# Altium footprint library JL_PCB.PCBLIB: 1129 footprints (part 47 of 72)
Each footprint in its own frame and in the unit in brackets; x right, y up, seen from the top. Pads: shape width x height; smd on the part's side, far side on the other; paste and mask are expansions set on the pad; w line width, h text height; cw(c..) or ccw(c..) is an arc to the next point about the centre after c.
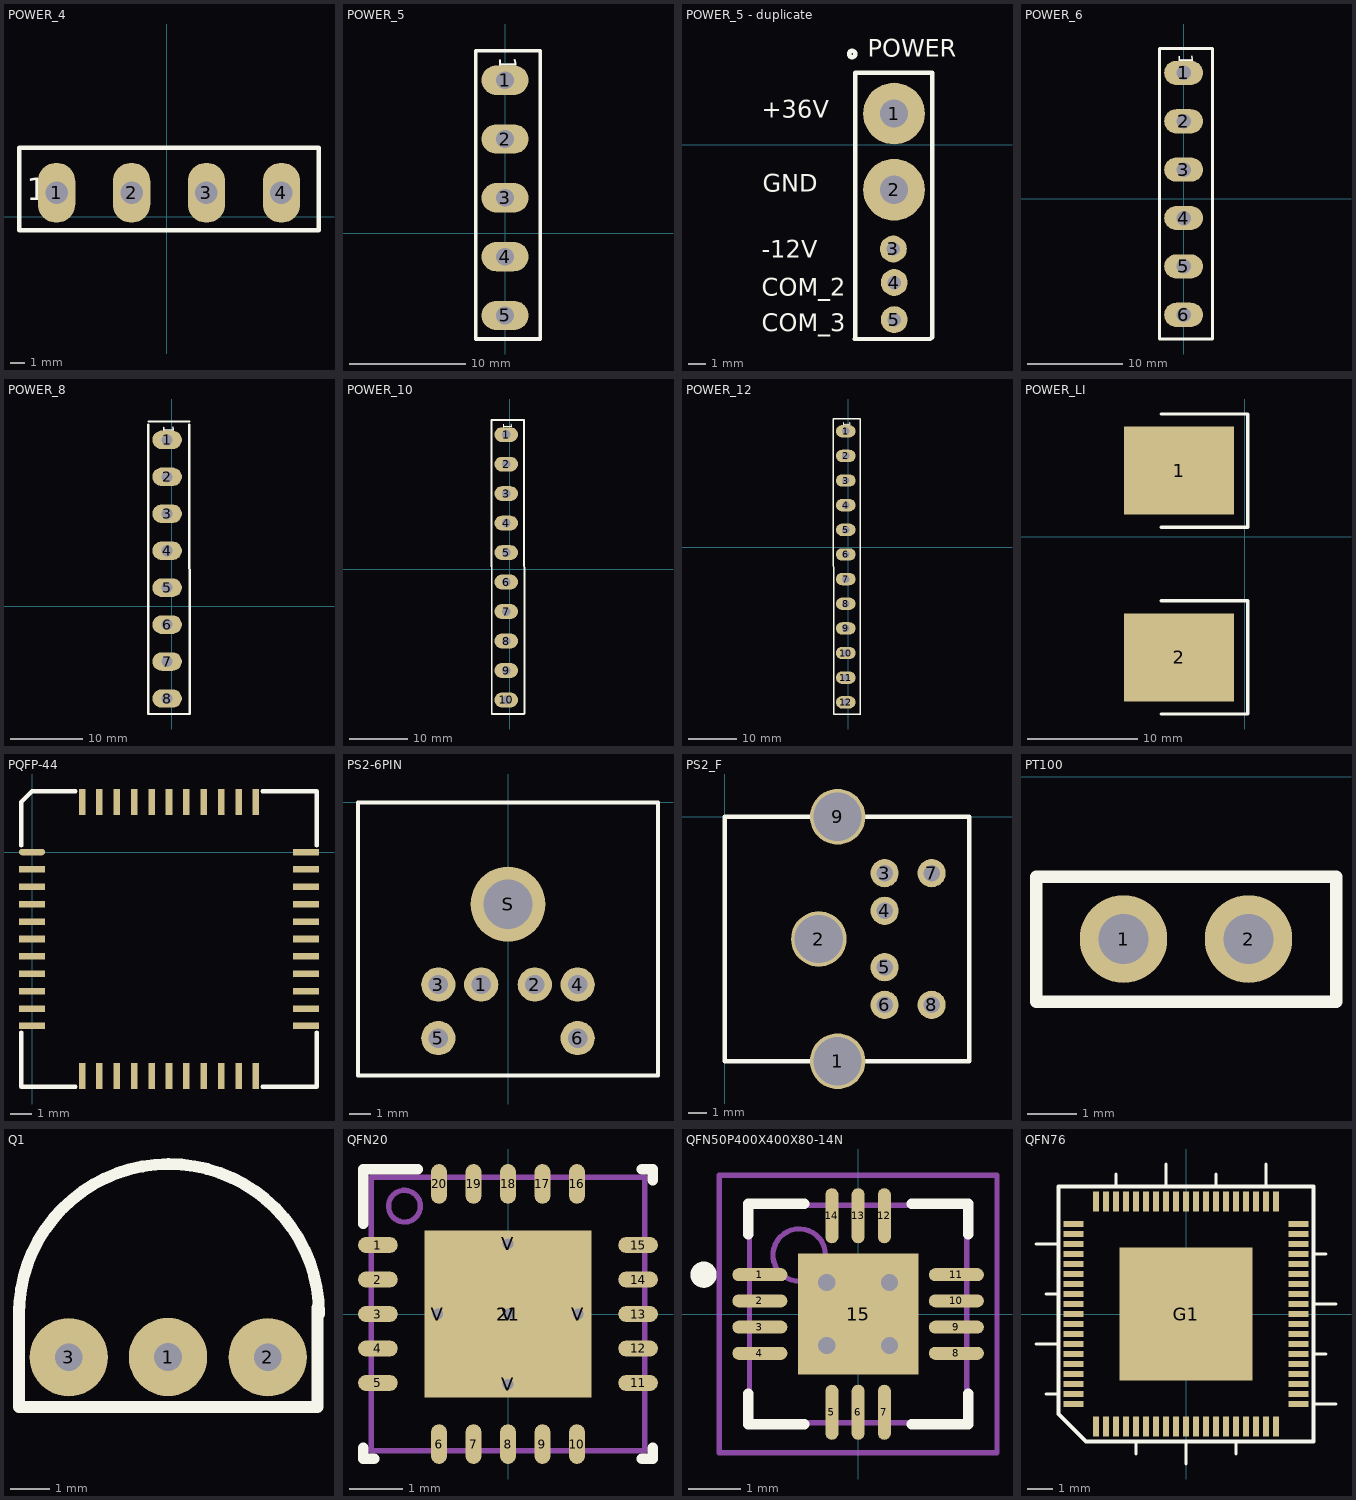
[diagram p46: the footprints below, top view; thin cyan lines are the x and y axes]

## POWER_4 [mil]
pads (4):
  oval 100x160 hole 60: 1(-294,64) 2(-94,64) 3(106,64) 4(306,64)
TopOverlay:
  lines w12: -394,-36 -394,184 406,184 406,-36 -394,-36
  text "1" at -374,44 h60

## POWER_5 [mil]
pads (5):
  oval 160x100 hole 60: 1(0,520) 2(0,320) 3(0,120) 4(0,-80) 5(0,-280)
TopOverlay:
  lines w12: -100,-360 -100,620 120,620 120,-360 -100,-360
  text "1" at -20,600 h60

## POWER_5 - duplicate [mil]
pads (5):
  round 137.79 hole 62.99: 1(730,70) 2(730,-100)
  round 60 hole 30: 3(728.39,-232.09) 4(730.35,-306.89) 5(730.35,-389.57)
TopOverlay:
  circle w10: c636.64,202.95 r7.1
  lines w10: 641.77,-432.87 811.06,-432.87 815,-428.94 815,161.61 643.74,161.61 643.74,-430.9 641.77,-432.87
  text "COM_3" at 435.08,-415.16 h39.37
  text "COM_2" at 435.08,-336.42 h39.37
  text "-12V" at 435.08,-251.77 h39.37
  text "GND" at 437.05,-104.13 h39.37
  text "+36V" at 435.08,61.22 h39.37
  text "POWER" at 671.3,197.05 h39.37

## POWER_6 [mil]
pads (6):
  oval 160x100 hole 60: 1(0,520) 2(0,320) 3(0,120) 4(0,-80) 5(0,-280) 6(0,-480)
TopOverlay:
  lines w12: -100,-580 120,-580 120,620 -100,620 -100,-580
  text "1" at -20,600 h60

## POWER_8 [mil]
pads (8):
  oval 160x100 hole 60: 1(-24,901.19) 2(-24,701.19) 3(-24,501.19) 4(-24,301.19) 5(-24,101.19) 6(-24,-98.81) 7(-24,-298.81) 8(-24,-498.81)
TopOverlay:
  lines w12: -125.98,984.25 -125.98,-582.68 98.42,-582.68 ; -124,1001.19 96,1001.19 ; 96,984.25 98.42,-578.74
  text "1" at -44,981.19 h60

## POWER_10 [mil]
pads (10):
  oval 160x100 hole 60: 1(-24,913) 2(-24,713) 3(-24,513) 4(-24,313) 5(-24,113) 6(-24,-87) 7(-24,-287) 8(-24,-487) 9(-24,-687) 10(-24,-887)
TopOverlay:
  lines w12: 97,-982 -123,-982 -124,1013 96,1013 100,-980
  text "1" at -44,993 h60

## POWER_12 [mil]
pads (12):
  oval 160x100 hole 60: 1(-22,940) 2(-22,740) 3(-22,540) 4(-22,340) 5(-22,140) 6(-22,-60) 7(-22,-260) 8(-22,-460) 9(-22,-660) 10(-22,-860) 11(-22,-1060) 12(-22,-1260)
TopOverlay:
  lines w12: 98,-1355 98,1040 -122,1040 -121,-1355 99,-1355
  text "1" at -42,1020 h60

## POWER_LI [mm]
pads (2):
  rect 10x8 smd: 1(-6,6) 2(-6,-11)
TopOverlay:
  lines w0.305: -7.635,-16.159 0.27,-16.159 0.27,-5.841 -7.635,-5.841 ; -7.635,0.841 0.27,0.841 0.27,11.159 -7.635,11.159

## PQFP-44 [mm]
pads (44):
  oval 1.2x0.3 smd: 1(0,0)
  rect 1.2x0.3 smd: 2(0,-0.8) 3(0,-1.6) 4(0,-2.4) 5(0,-3.2) 6(0,-4) 7(0,-4.8) 8(0,-5.6) 9(0,-6.4) 10(0,-7.2) 11(0,-8) 23(12.6,-8) 24(12.6,-7.2) 25(12.6,-6.4) 26(12.6,-5.6) 27(12.6,-4.8) 28(12.6,-4) 29(12.6,-3.2) 30(12.6,-2.4) 31(12.6,-1.6) 32(12.6,-0.8) 33(12.6,0)
  rect 0.3x1.2 smd: 12(2.3,-10.3) 13(3.1,-10.3) 14(3.9,-10.3) 15(4.7,-10.3) 16(5.5,-10.3) 17(6.3,-10.3) 18(7.1,-10.3) 19(7.9,-10.3) 20(8.7,-10.3) 21(9.5,-10.3) 22(10.3,-10.3) 34(10.3,2.3) 35(9.5,2.3) 36(8.7,2.3) 37(7.9,2.3) 38(7.1,2.3) 39(6.3,2.3) 40(5.5,2.3) 41(4.7,2.3) 42(3.9,2.3) 43(3.1,2.3) 44(2.3,2.3)
TopOverlay:
  lines w0.2: -0.5,-8.3 -0.5,-10.8 2,-10.8 ; -0.5,0.3 -0.5,2.3 0,2.8 2,2.8 ; 10.6,-10.8 13.1,-10.8 13.1,-8.3 ; 10.6,2.8 13.1,2.8 13.1,0.3

## PS2-6PIN [mm] "PS2 Socket, 6 Pin, Through Hole"
pads (7):
  round 1.6 hole 0.9: 1(-1.25,-8.5) 2(1.25,-8.5) 3(-3.25,-8.5) 4(3.25,-8.5) 5(-3.25,-11) 6(3.25,-11)
  round 3.5 hole 2.3: S(0,-4.75)
TopOverlay:
  lines w0.2: -7,-12.75 7,-12.75 7,0 -7,0 -7,-12.75

## PS2_F [mil]
pads (9):
  round 118.11 hole 102.36: 1(240,-520) 2(200,-260) 9(240,0)
  round 60 hole 35: 3(340,-120) 4(340,-200) 5(340,-320) 6(340,-400) 7(440,-120) 8(440,-400)
TopOverlay:
  lines w10: 0,-140 0,-120 ; 0,-520 0,0 520,0 520,-520 0,-520

## PT100 [mil]
pads (2):
  round 70 hole 40: 1(570,-130) 2(670,-130)
TopOverlay:
  lines w10: 500,-180 740,-180 740,-80 500,-80 500,-180

## Q1 [mm]
pads (3):
  round 2 hole 0.711: 1(34.736,-62.88) 2(37.28,-62.886) 3(32.2,-62.886)
TopOverlay:
  lines w0.3: 30.93,-61.81 cw(c34.76,-61.781) 38.59,-61.781
  lines w0.305: 30.93,-61.616 30.93,-64.156 38.55,-64.156 38.55,-61.616

## QFN20 [mm]
pads (26):
  oval 0.75x0.3 smd paste-0.102 mask+0.051: 1(-2.452,1.3) 2(-2.452,0.65) 3(-2.452,0) 4(-2.452,-0.65) 5(-2.452,-1.3) 11(2.452,-1.3) 12(2.452,-0.65) 13(2.452,0) 14(2.452,0.65) 15(2.452,1.3)
  oval 0.3x0.75 smd paste-0.102 mask+0.051: 6(-1.3,-2.452) 7(-0.65,-2.452) 8(0,-2.452) 9(0.65,-2.452) 10(1.3,-2.452) 16(1.3,2.452) 17(0.65,2.452) 18(0,2.452) 19(-0.65,2.452) 20(-1.3,2.452)
  rect 3.15x3.15 smd paste-1.562 mask+0.051: 21(0,0)
  round 0.5 / inner round 1.524 / far side round 0.5 hole 0.203 mask+0.051: V(-1.325,0) V(0,-1.325) V(0,0) V(0,1.325) V(1.325,0)
TopOverlay:
  lines w0.2: -2.725,-2.525 -2.725,-2.725 -2.525,-2.725 ; -2.725,1.7 -2.725,2.725 -1.7,2.725 ; 2.525,-2.725 2.725,-2.725 2.725,-2.525 ; 2.525,2.725 2.725,2.725 2.725,2.525
TopPaste:
  region: 0.1,1.468 0.1,0.1 1.468,0.1 1.468,1.468
  region: -0.1,0.1 -0.1,1.468 -1.468,1.468 -1.468,0.1
  region: -0.1,-1.468 -0.1,-0.1 -1.468,-0.1 -1.468,-1.468
  region: 0.1,-0.1 0.1,-1.468 1.468,-1.468 1.468,-0.1
Mechanical13:
  circle w0.1: c-1.951,2.032 r0.3
  lines w0.1: -2.575,-2.575 -2.575,2.575 2.575,2.575 2.575,-2.575 -2.575,-2.575

## QFN50P400X400X80-14N [mm] "QFN, 14-Leads, Body 4.2x4.2mm (max), Pitch 0.50mm, IPC Medium Density"
height 3.55
pads (15):
  oval 1.05x0.25 smd: 1(-1.875,0.75) 2(-1.875,0.25) 3(-1.875,-0.25) 4(-1.875,-0.75) 8(1.875,-0.75) 9(1.875,-0.25) 10(1.875,0.25) 11(1.875,0.75)
  oval 0.25x1.05 smd: 5(-0.5,-1.875) 6(0,-1.875) 7(0.5,-1.875) 12(0.5,1.875) 13(0,1.875) 14(-0.5,1.875)
  rect 2.3x2.3 smd: 15(0,0)
via -0.6,0.6 diameter 0.66 hole 0.33
via 0.6,0.6 diameter 0.66 hole 0.33
via -0.6,-0.6 diameter 0.66 hole 0.33
via 0.6,-0.6 diameter 0.66 hole 0.33
TopOverlay:
  circle w0.25: c-2.95,0.75 r0.125
  lines w0.2: -2.1,-1.525 -2.1,-2.1 -1.025,-2.1 ; -2.1,1.525 -2.1,2.1 -1.025,2.1 ; 1.025,-2.1 2.1,-2.1 2.1,-1.525 ; 1.025,2.1 2.1,2.1 2.1,1.525
Mechanical13:
  circle w0.1: c-1.125,1.125 r0.5
  lines w0.1: -2.075,-2.075 -2.075,2.075 2.075,2.075 2.075,-2.075 -2.075,-2.075
Mechanical15:
  lines w0.1: -0.5,0 0.5,0 ; 0,-0.5 0,0.5 ; -2.65,-2.65 -2.65,2.65 2.65,2.65 2.65,-2.65 -2.65,-2.65
3D body: height 0.8, standoff 0.01, extent -2.075,-2.075 2.075,2.075

## QFN76 [mil] "QFN76"
pads (77):
  rect 9x32 smd: 1(-141.73,-177.16) 2(-125.98,-177.16) 3(-110.24,-177.16) 4(-94.49,-177.16) 5(-78.74,-177.16) 6(-62.99,-177.16) 7(-47.24,-177.16) 8(-31.5,-177.16) 9(-15.75,-177.16) 10(0,-177.16) 11(15.75,-177.16) 12(31.5,-177.16) 13(47.24,-177.16) 14(62.99,-177.16) 15(78.74,-177.16) 16(94.49,-177.16) 17(110.24,-177.16) 18(125.98,-177.16) 19(141.73,-177.16) 39(141.73,177.16) 40(125.98,177.16) 41(110.24,177.16) 42(94.49,177.16) 43(78.74,177.16) 44(62.99,177.16) 45(47.24,177.16) 46(31.5,177.16) 47(15.75,177.16) 48(0,177.16) 49(-15.75,177.16) 50(-31.5,177.16) 51(-47.24,177.16) 52(-62.99,177.16) 53(-78.74,177.16) 54(-94.49,177.16) 55(-110.24,177.16) 56(-125.98,177.16) 57(-141.73,177.16)
  rect 32x9 smd: 20(177.16,-141.73) 21(177.16,-125.98) 22(177.16,-110.24) 23(177.16,-94.49) 24(177.16,-78.74) 25(177.16,-62.99) 26(177.16,-47.24) 27(177.16,-31.5) 28(177.16,-15.75) 29(177.16,0) 30(177.16,15.75) 31(177.16,31.5) 32(177.16,47.24) 33(177.16,62.99) 34(177.16,78.74) 35(177.16,94.49) 36(177.16,110.24) 37(177.16,125.98) 38(177.16,141.73) 58(-177.16,141.73) 59(-177.16,125.98) 60(-177.16,110.24) 61(-177.16,94.49) 62(-177.16,78.74) 63(-177.16,62.99) 64(-177.16,47.24) 65(-177.16,31.5) 66(-177.16,15.75) 67(-177.16,0) 68(-177.16,-15.75) 69(-177.16,-31.5) 70(-177.16,-47.24) 71(-177.16,-62.99) 72(-177.16,-78.74) 73(-177.16,-94.49) 74(-177.16,-110.24) 75(-177.16,-125.98) 76(-177.16,-141.73)
  rect 210x210 smd: G1(0,0)
TopOverlay:
  lines w1: -200.79,-157.48 -200.79,200.79 200.79,200.79 200.79,-200.79 -157.48,-200.79 -177.16,-181.1 -200.79,-157.48
  lines w5: -236.22,-47.24 -200.79,-47.24 ; -236.22,110.24 -200.79,110.24 ; -220.47,-125.98 -200.79,-125.98 ; -220.47,31.5 -200.79,31.5 ; -110.24,200.79 -110.24,220.47 ; -78.74,-220.47 -78.74,-200.79 ; -31.5,200.79 -31.5,236.22 ; 0,-236.22 0,-200.79 ; 47.24,200.79 47.24,220.47 ; 78.74,-220.47 78.74,-200.79 ; 125.98,200.79 125.98,236.22 ; 200.79,-141.73 236.22,-141.73 ; 200.79,-62.99 220.47,-62.99 ; 200.79,15.75 236.22,15.75 ; 200.79,94.49 220.47,94.49
  lines w6: -200.79,-157.48 -177.16,-181.1 -157.48,-200.79 200.79,-200.79 200.79,200.79 -200.79,200.79 -200.79,-157.48